# Altium footprint library rcl.PCBLIB: 513 footprints (part 21 of 33)
Each footprint in its own frame and in the unit in brackets; x right, y up, seen from the top. Pads: shape width x height; smd on the part's side, far side on the other; paste and mask are expansions set on the pad; w line width, h text height; cw(c..) or ccw(c..) is an arc to the next point about the centre after c.
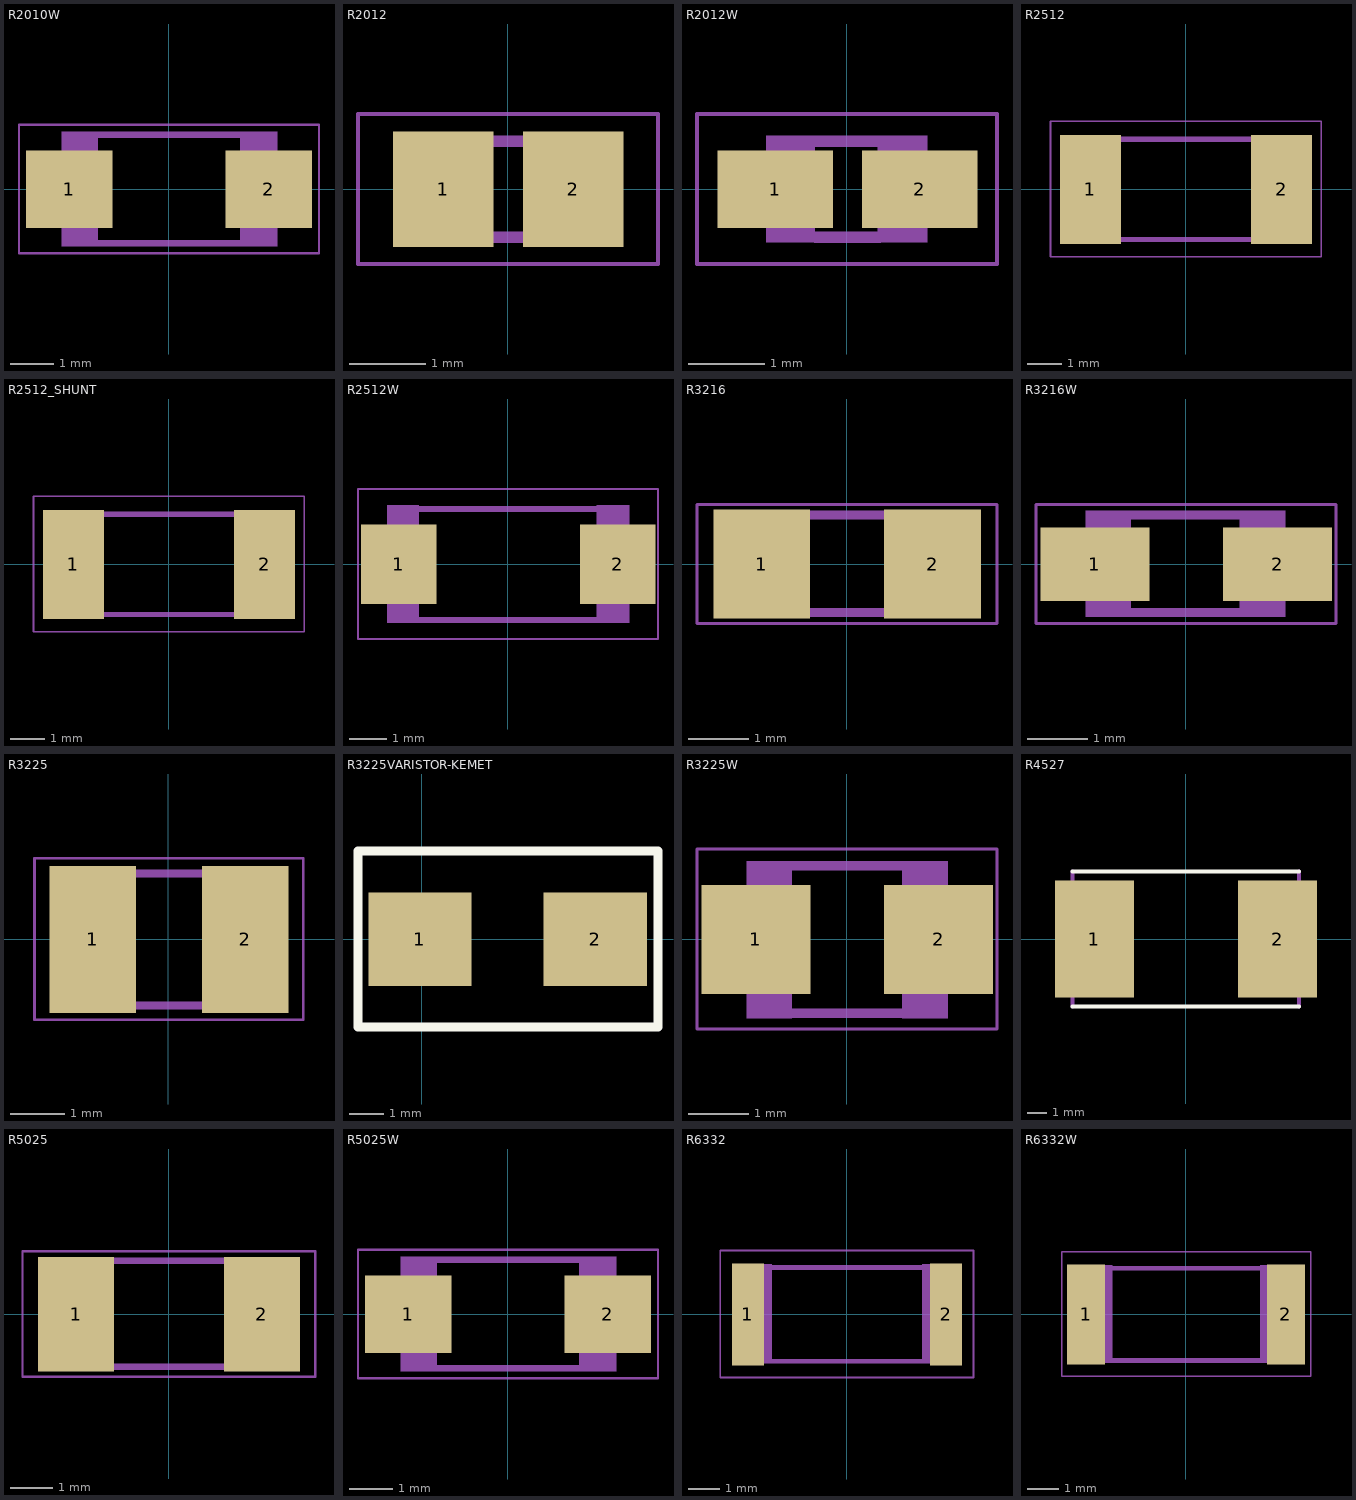
[diagram p20: the footprints below, top view; thin cyan lines are the x and y axes]

## R2010W [mil]
pads (2):
  rect 79x71 smd: 1(-90.98,0) 2(91,0)
Mechanical 4:
  rectangle: 65,-52 99,53
  rectangle: -98,-52 -64.54,53
  lines w2: -136.73,-58.39 -136.73,59 137,59 137,-58.39 -136.73,-58.39
  lines w6: -65.43,50 66,50 ; -64.45,-49.02 67,-49.02

## R2012 [mil]
pads (2):
  rect 52x60 smd: 1(-33.46,0) 2(34,0)
Mechanical 4:
  rectangle: -42,-27.5 -16.41,28
  rectangle: 16,-27.5 42,28
  lines w2: -77.68,-38.7 -77.68,39 78,39 78,-38.7 -77.68,-38.7
  lines w6: -16.14,-25 17,-25 ; -16.14,25 17,25

## R2012W [mil]
pads (2):
  rect 60x40 smd: 1(-37.01,0) 2(38,0)
Mechanical 4:
  rectangle: -42,-27.5 -16.41,28
  rectangle: 16,-27.5 42,28
  lines w2: -77.68,-38.7 -77.68,39 78,39 78,-38.7 -77.68,-38.7
  lines w6: -16.14,-25 17,-25 ; -16.14,25 17,25

## R2512 [mil]
pads (2):
  rect 71x126 smd: 1(-110.24,0) 2(111,0)
Mechanical 4:
  rectangle: 93,-61 127,62
  rectangle: -126,-61 -92.54,62
  lines w2: -156.42,-78.07 -156.42,79 157,79 157,-78.07 -156.42,-78.07
  lines w6: -92.99,-57.99 94,-57.99 ; -92.99,58 94,58

## R2512_SHUNT [mil]
pads (2):
  rect 71x126 smd: 1(-110.24,0) 2(111,0)
Mechanical 4:
  rectangle: -126,-61 -92.54,62
  rectangle: 93,-61 127,62
  lines w2: -156.42,-78.07 157,-78.07 157,79 -156.42,79 -156.42,-78.07
  lines w6: -92.99,-57.99 94,-57.99 ; -92.99,58 94,58
3D body "WSLF2512 (0.003 ohm.stp": height 34, standoff 0, extent -125,-62.01 125,62.99

## R2512W [mil]
pads (2):
  rect 79x83 smd: 1(-114.02,0) 2(115,0)
Mechanical 4:
  rectangle: 93,-61 127,62
  rectangle: -126,-61 -92.54,62
  lines w2: -156.42,-78.07 -156.42,79 157,79 157,-78.07 -156.42,-78.07
  lines w6: -92.99,-57.99 94,-57.99 ; -92.99,58 94,58

## R3216 [mil]
pads (2):
  rect 63x71 smd: 1(-55.12,0) 2(56,0)
Mechanical 4:
  rectangle: -65,-34.5 -35.47,35
  rectangle: 35,-34.5 65,35
  lines w2: -97.36,-38.7 98,-38.7 98,39 -97.36,39 -97.36,-38.7
  lines w6: -35.94,-31.5 35,-31.5 ; -35.94,32 35,32

## R3216W [mil]
pads (2):
  rect 71x48 smd: 1(-59.02,0) 2(60,0)
Mechanical 4:
  rectangle: 35,-34.5 65,35
  rectangle: -65,-34.5 -35.47,35
  lines w2: -97.36,-38.7 -97.36,39 98,39 98,-38.7 -97.36,-38.7
  lines w6: -35.94,-31.5 35,-31.5 ; -35.94,32 35,32

## R3225 [mil]
pads (2):
  rect 63x107 smd: 1(-55.12,0) 2(56,0)
Mechanical 4:
  rectangle: -65,-51.5 -35.47,51
  rectangle: 36,-51.5 66,51
  lines w2: -97.36,-58.39 98,-58.39 98,59 -97.36,59 -97.36,-58.39
  lines w6: -35.94,-47.99 37,-47.99 ; -35.94,48 37,48

## R3225VARISTOR-KEMET [mm]
pads (2):
  rect 3x2.718 smd: 1(-0.05,0) 2(5.05,0)
Top Overlay:
  lines w0.254: -1.85,-2.55 -1.85,2.575 -0.5,2.575 6.875,2.575 6.875,-2.55 3.25,-2.55 2.2,-2.55 0.1,-2.55 -1.85,-2.55
3D body: height 2.3, standoff 0, extent 5.7,-1.313 6.35,1.312
3D body: height 2.3, standoff 0, extent -1.35,-1.3 -0.7,1.325
3D body: height 4.7, standoff 0, extent -0.9,-2.325 5.9,2.35

## R3225W [mil]
pads (2):
  rect 71x71 smd: 1(-59.02,0) 2(60,0)
Mechanical 4:
  rectangle: -65,-51.5 -35.47,51
  rectangle: 36,-51.5 66,51
  lines w2: -97.36,-58.39 98,-58.39 98,59 -97.36,59 -97.36,-58.39
  lines w6: -35.94,-47.99 37,-47.99 ; -35.94,48 37,48

## R4527 [mil]
pads (2):
  rect 156x230 smd: 1(-180.12,0) 2(181,0)
Top Overlay:
  lines w8: -223.43,-132.87 223,-132.87 ; -223.43,133 223,133
Mechanical 4:
  lines w8: -223.43,-132.87 -223.43,133 ; 223,-132.87 223,133

## R5025 [mil]
pads (2):
  rect 71x107 smd: 1(-86.61,0) 2(87,0)
Mechanical 4:
  rectangle: -98,-52 -64.54,53
  rectangle: 65,-52 99,53
  lines w2: -136.73,-58.39 137,-58.39 137,59 -136.73,59 -136.73,-58.39
  lines w6: -65.43,50 66,50 ; -64.45,-49.02 67,-49.02

## R5025W [mil]
pads (2):
  rect 79x71 smd: 1(-90.98,0) 2(91,0)
Mechanical 4:
  rectangle: 65,-52 99,53
  rectangle: -98,-52 -64.54,53
  lines w2: -136.73,-58.39 -136.73,59 137,59 137,-58.39 -136.73,-58.39
  lines w6: -65.43,50 66,50 ; -64.45,-49.02 67,-49.02

## R6332 [mil]
pads (2):
  rect 40x126 smd: 1(-122.05,0) 2(123,0)
Mechanical 4:
  rectangle: 93,-61 127,62
  rectangle: -126,-61 -92.54,62
  lines w2: -156.42,-78.07 -156.42,79 157,79 157,-78.07 -156.42,-78.07
  lines w6: -92.99,-57.99 94,-57.99 ; -92.99,58 94,58

## R6332W [mil]
pads (2):
  rect 48x126 smd: 1(-125.83,0) 2(126,0)
Mechanical 4:
  rectangle: 93,-61 127,62
  rectangle: -126,-61 -92.54,62
  lines w2: -156.42,-78.07 -156.42,79 157,79 157,-78.07 -156.42,-78.07
  lines w6: -92.99,-57.99 94,-57.99 ; -92.99,58 94,58